# Altium integrated library TI Power Management DC-DC Controller (External Switch).IntLib: 349 symbols (part 14 of 22) (continued)
## TPS51120RHBR (continued)

## TPS51120RHBRG4
designator U?
Dual Current Mode, Synch Step-Down Controller with 100 mA Standby Reg for Notebook System Power, 88 % Duty Cycle, 4.5 to 28 V, -40 to 85 degC, 32-pin QFN (RHB), Green (RoHS & no Sb/Br); Manufacturer: Texas Instruments; PartNumber: TPS51120RHBRG4; Duty Cycle(Max)(%): 88; Iout(Max)(A): 20; Regulated Outputs(#): 2; SubFamily: Multiple-Output Switching Controller; Switching Frequency(Max)(kHz): 580; Synchronous Rectification: TRUE; Topology: Buck, D-CAP Mode"; Vin(Max)(V): 28; Vin(Min)(V): 4.5; Vout(Max)(V): 5.5; Vout(Min)(V): 1.05; DatasheetVersion: SLUS670B; PackageVersion: revD, Jun-2011; PackageReference: RHB32-3450X3450TP; PackageDescription: 32-Pin Plastic Quad Flat No-Lead, 5 x 5 mm Body, 0.5 mm Pitch, 3.45 x 3.45 mm Exposed Pad; Supplier 1: Digi-Key; Supplier Part Number 1: TPS51120RHBRG4-ND; Eco-Plan: Green (RoHS & no Sb/Br); Iout2(A): 20; Vout2(Max)(V): 5.5; Vout2(Min)(V): 1.05; Mounting Technology: Surface Mount; Code_JEDEC: MO-220; ComponentLink1Description: Datasheet; ComponentLink1URL: http://www.ti.com/general/docs/lit/getliterature.tsp?genericPartNumber=TPS51120&fileType=pdf; ComponentLink2Description: Package Specification; ComponentLink2URL: http://www.ti.com/litv/pdf/mpqf130c
footprint RHB32-3450X3450TP (QFN, 32-Leads, Body 5x5mm, Pitch 0.5mm, Thermal Pad 3.45x3.45mm, TI Recommended)
pins: 1 VO1 (in) "These terminals serve four functions: on-time adjustment, output discharge, VREG5, VREG3 switchover input and feedback inputs for 5-V, 3.3-V fixed-output option. Connect to positive terminal of respective switch mode power (See Datasheet)", 2 COMP1 "Loop compensation pin (error amplifier output). Connect RC from this pin to GND for proper loop compensation with current mode operation. Tie this pin to V5FILT for D-CAP mode operation.", 3 VFB1 (in) "SMPS feedback input. Connect the feedback resistor divider here for adjustable outputs. Tie these pins to V5FILT or for fixed output option. Refer to Table 2", 4 VREF2 (out) "2-V reference output. Capable of +/-50-uA, +/-2% over 0 - 85degreesC temperature range. Bypass to GND by 1-nF ceramic capacitor. Tie this pin to GND disables both SMPS.", 5 GND (power) "Signal ground pin.", 6 VFB2 (in) "SMPS feedback input. Connect the feedback resistor divider here for adjustable outputs. Tie these pins to V5FILT or for fixed output option. Refer to Table 2", 7 COMP2 "Loop compensation pin (error amplifier output). Connect RC from this pin to GND for proper loop compensation with current mode operation. Tie this pin to V5FILT for D-CAP mode operation.", 8 VO2 (in) "These terminals serve four functions: on-time adjustment, output discharge, VREG5, VREG3 switchover input and feedback inputs for 5-V, 3.3-V fixed-output option. Connect to positive terminal of respective switch mode power (See Datasheet)", 9 EN5 (in) "VREG5, 5-V low dropout linear regulator enable pin. Connect to GND to disable. Float or tie to VBAT to turn on the regulator.", 10 EN3 (in) "VREG3, 3.3-V low dropout linear regulator enable pin. Connect to GND to disable. Float or tie to enabled VREG5 to turn on the regulator.", 11 PGOOD2 (oc) "Power-good window comparator open drain output. Pull up with resistor to V5FILT or appropriate signal voltage. Current capability is 5-mA. PGOOD goes high 1-ms after VFB is within specified limits. Power bad (terminal goes (See Datasheet)", 12 EN2 (in) "Channel 1 and Channel 2 SMPS enable pins. Connect to 5 V to turn on with internal 3-ms soft-start. Slower soft-start is possible by applying an external capacitor from each of these pins to ground to program ramp rate.", 13 VBST2 (power) "Supply Input for High-side MOSFET Driver. Connect capacitor from this pin to respective LL terminal. An internal PN diode is connected between VREG5 to each of these pins. User can add external schottky diode if forward drop (See Datasheet)", 14 DRVH2 (out) "High-side MOSFET gate drive output. Source 3.5 Ohm, sink 1.5 Ohm, LL-node referenced floating driver. Drive voltage corresponds to VBST to LL voltage.", 15 LL2 (power) "High-side MOSFET gate driver return. Also serve as current sense comparator input (-) for RDS(on) sensing, and input voltage monitor for on-time control circuitry", 16 DRVL2 (out) "Rectifying (low-side) MOSFET gate drive output. Source 3.5 Ohm, sink 1.5 Ohm, PGND referenced driver. Drive voltage is VREG5 voltage.", 17 PGND2 (power) "Ground return for rectifying MOSFET gate driver. Connect PGND2, PGND1 and GND strongly together near the source of the rectifying FET or the GND connection of the current sense resistor. Also serve as current sense (See Datasheet)", 18 CS2 (in) "Current sense comparator input (-) for resistor sensing scheme. Or, overcurrent trip setting input for RDS(on) current sense scheme if connected to V5FILT through the threshold setting resistor.", 19 VREG3 (power) "3.3-V, 100-uA low dropout linear regulator output. Bypass to PGND by 10-mF ceramic capacitor. Runs from VIN supply. Shuts off with EN3. Switches over to VO2 when 3.1 V or above is provided.", 20 V5FILT (power) "5-V supply input for the entire control circuit. Should be provided from VREG5 via RC filter.", 21 VREG5 (power) "5-V, 100-mA low dropout linear regulator output. Bypass to PGND by 10-uF ceramic capacitor. Runs from VIN supply. Internally connected to VBST and DRVL. Shuts off with EN5. Switches over to VO1 when 4.8 V or above is (See Datasheet)", 22 VIN (power) "Supply Input for 5-V and 3.3-V linear regulator. Typically connected to VBAT.", 23 CS1 (in) "Current sense comparator input (-) for resistor sensing scheme. Or, overcurrent trip setting input for RDS(on) current sense scheme if connected to V5FILT through the threshold setting resistor.", 24 PGND1 (power) "Ground return for rectifying MOSFET gate driver. Connect PGND2, PGND1 and GND strongly together near the source of the rectifying FET or the GND connection of the current sense resistor. Also serve as current sense (See Datasheet)", 25 DRVL1 (out) "Rectifying (low-side) MOSFET gate drive output. Source 3.5 Ohm, sink 1.5 Ohm, PGND referenced driver. Drive voltage is VREG5 voltage.", 26 LL1 (power) "High-side MOSFET gate driver return. Also serve as current sense comparator input (-) for RDS(on) sensing, and input voltage monitor for on-time control circuitry", 27 DRVH1 (out) "High-side MOSFET gate drive output. Source 3.5 Ohm, sink 1.5 Ohm, LL-node referenced floating driver. Drive voltage corresponds to VBST to LL voltage.", 28 VBST1 (power) "Supply Input for High-side MOSFET Driver. Connect capacitor from this pin to respective LL terminal. An internal PN diode is connected between VREG5 to each of these pins. User can add external schottky diode if forward drop (See Datasheet)", 29 EN1 (in) "Channel 1 and Channel 2 SMPS enable pins. Connect to 5 V to turn on with internal 3-ms soft-start. Slower soft-start is possible by applying an external capacitor from each of these pins to ground to program ramp rate.", 30 PGOOD1 (oc) "Power-good window comparator open drain output. Pull up with resistor to V5FILT or appropriate signal voltage. Current capability is 5-mA. PGOOD goes high 1-ms after VFB is within specified limits. Power bad (terminal goes (See Datasheet)", 31 TONSEL (in) "On-time selection pin. Refer to Table 1 and Table 2.", 32 SKIPSEL (in) "Skip and fault mode selection pin. Refer to Table 2", 33 EP (power) "EXPOSED THERMAL PAD"

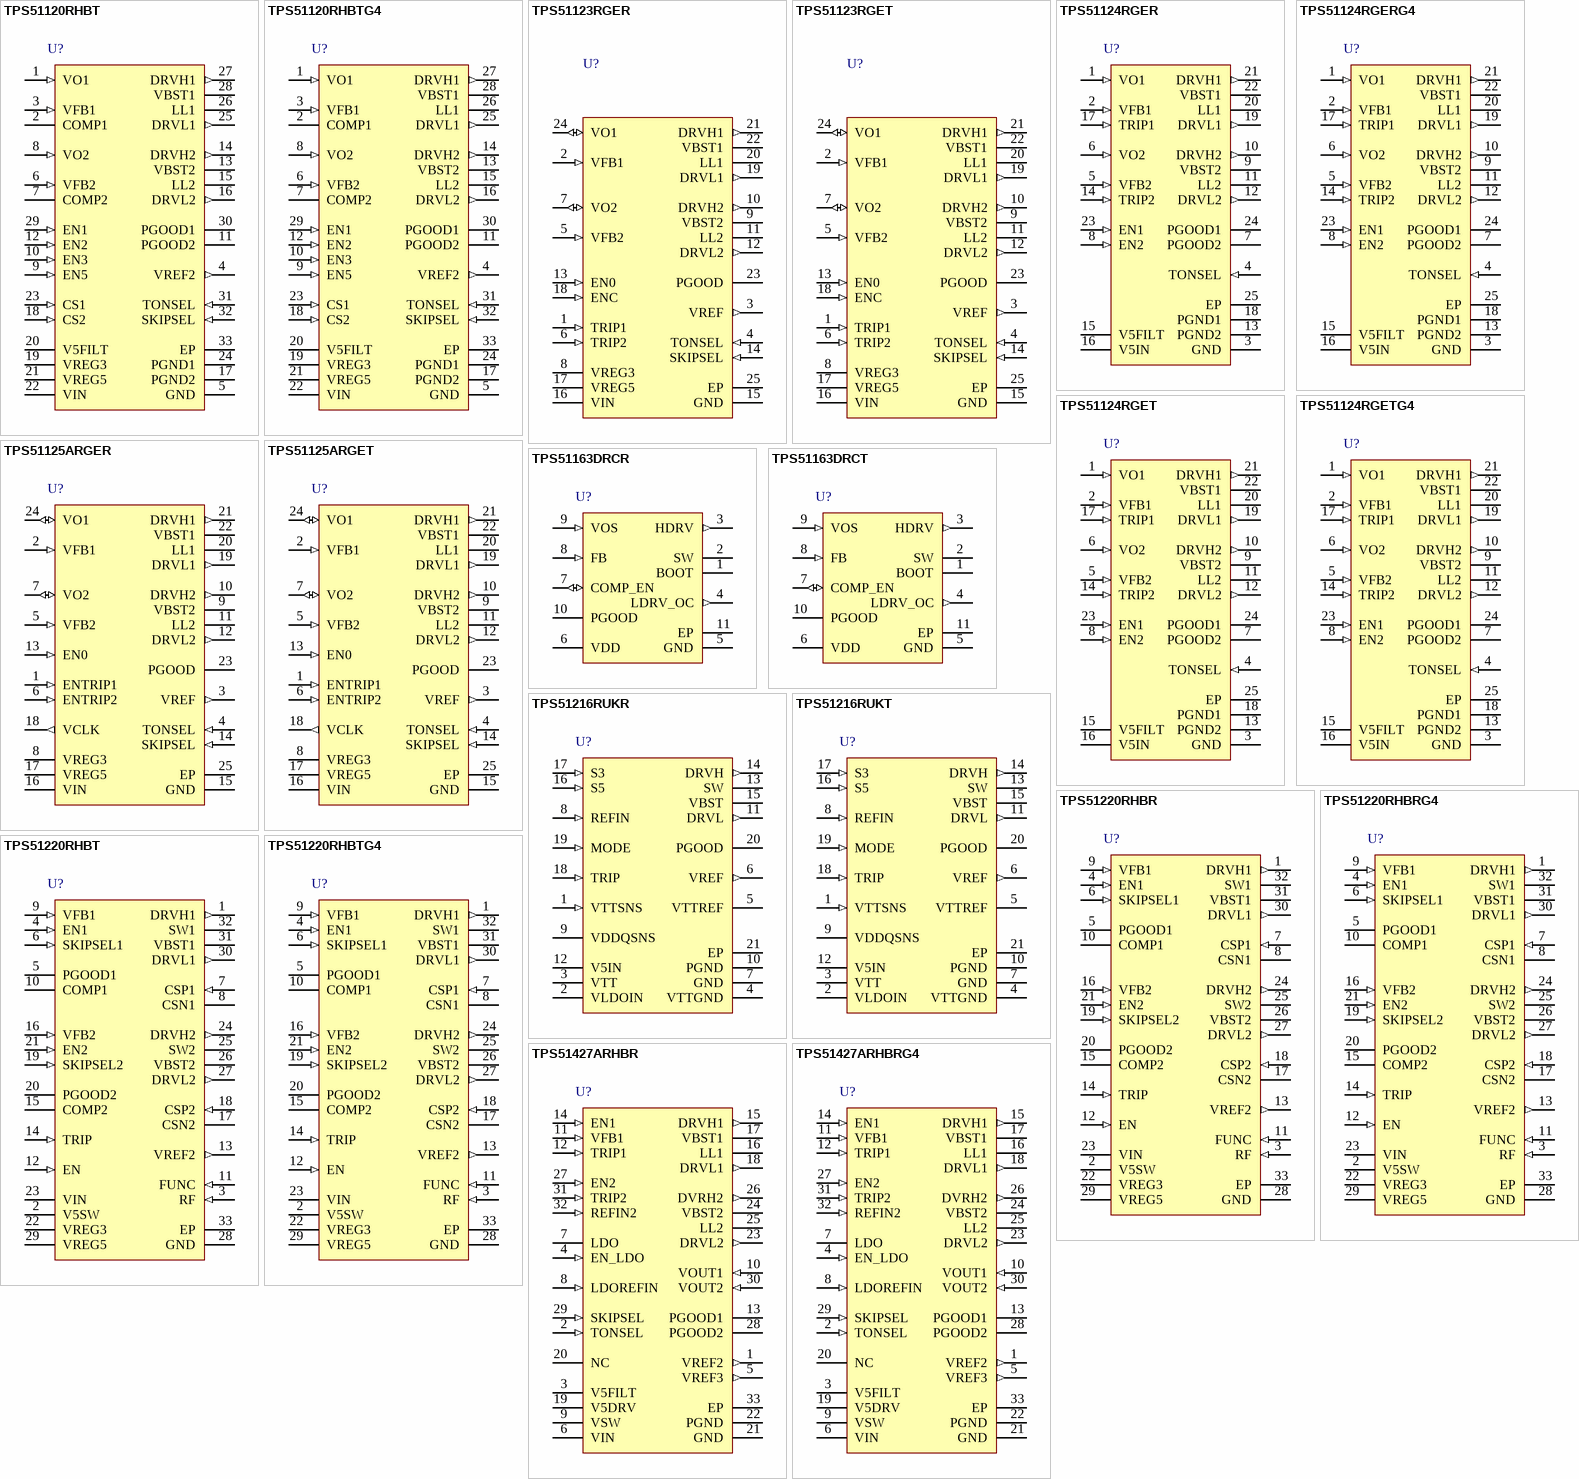
[diagram p10: symbols TPS51120RHBT to TPS51427ARHBRG4]

## TPS51120RHBT
designator U?
Dual Current Mode, Synch Step-Down Controller with 100 mA Standby Reg for Notebook System Power, 88 % Duty Cycle, 4.5 to 28 V, -40 to 85 degC, 32-pin QFN (RHB), Green (RoHS & no Sb/Br); Manufacturer: Texas Instruments; PartNumber: TPS51120RHBT; Duty Cycle(Max)(%): 88; Iout(Max)(A): 20; Regulated Outputs(#): 2; SubFamily: Multiple-Output Switching Controller; Switching Frequency(Max)(kHz): 580; Synchronous Rectification: TRUE; Topology: Buck, D-CAP Mode"; Vin(Max)(V): 28; Vin(Min)(V): 4.5; Vout(Max)(V): 5.5; Vout(Min)(V): 1.05; DatasheetVersion: SLUS670B; PackageVersion: revD, Jun-2011; PackageReference: RHB32-3450X3450TP; PackageDescription: 32-Pin Plastic Quad Flat No-Lead, 5 x 5 mm Body, 0.5 mm Pitch, 3.45 x 3.45 mm Exposed Pad; Supplier 1: Digi-Key; Supplier Part Number 1: 296-18341-2-ND; Eco-Plan: Green (RoHS & no Sb/Br); Iout2(A): 20; Vout2(Max)(V): 5.5; Vout2(Min)(V): 1.05; Mounting Technology: Surface Mount; Code_JEDEC: MO-220; ComponentLink1Description: Datasheet; ComponentLink1URL: http://www.ti.com/general/docs/lit/getliterature.tsp?genericPartNumber=TPS51120&fileType=pdf; ComponentLink2Description: Package Specification; ComponentLink2URL: http://www.ti.com/litv/pdf/mpqf130c
footprint RHB32-3450X3450TP (QFN, 32-Leads, Body 5x5mm, Pitch 0.5mm, Thermal Pad 3.45x3.45mm, TI Recommended)
pins: 1 VO1 (in) "These terminals serve four functions: on-time adjustment, output discharge, VREG5, VREG3 switchover input and feedback inputs for 5-V, 3.3-V fixed-output option. Connect to positive terminal of respective switch mode power (See Datasheet)", 2 COMP1 "Loop compensation pin (error amplifier output). Connect RC from this pin to GND for proper loop compensation with current mode operation. Tie this pin to V5FILT for D-CAP mode operation.", 3 VFB1 (in) "SMPS feedback input. Connect the feedback resistor divider here for adjustable outputs. Tie these pins to V5FILT or for fixed output option. Refer to Table 2", 4 VREF2 (out) "2-V reference output. Capable of +/-50-uA, +/-2% over 0 - 85degreesC temperature range. Bypass to GND by 1-nF ceramic capacitor. Tie this pin to GND disables both SMPS.", 5 GND (power) "Signal ground pin.", 6 VFB2 (in) "SMPS feedback input. Connect the feedback resistor divider here for adjustable outputs. Tie these pins to V5FILT or for fixed output option. Refer to Table 2", 7 COMP2 "Loop compensation pin (error amplifier output). Connect RC from this pin to GND for proper loop compensation with current mode operation. Tie this pin to V5FILT for D-CAP mode operation.", 8 VO2 (in) "These terminals serve four functions: on-time adjustment, output discharge, VREG5, VREG3 switchover input and feedback inputs for 5-V, 3.3-V fixed-output option. Connect to positive terminal of respective switch mode power (See Datasheet)", 9 EN5 (in) "VREG5, 5-V low dropout linear regulator enable pin. Connect to GND to disable. Float or tie to VBAT to turn on the regulator.", 10 EN3 (in) "VREG3, 3.3-V low dropout linear regulator enable pin. Connect to GND to disable. Float or tie to enabled VREG5 to turn on the regulator.", 11 PGOOD2 (oc) "Power-good window comparator open drain output. Pull up with resistor to V5FILT or appropriate signal voltage. Current capability is 5-mA. PGOOD goes high 1-ms after VFB is within specified limits. Power bad (terminal goes (See Datasheet)", 12 EN2 (in) "Channel 1 and Channel 2 SMPS enable pins. Connect to 5 V to turn on with internal 3-ms soft-start. Slower soft-start is possible by applying an external capacitor from each of these pins to ground to program ramp rate.", 13 VBST2 (power) "Supply Input for High-side MOSFET Driver. Connect capacitor from this pin to respective LL terminal. An internal PN diode is connected between VREG5 to each of these pins. User can add external schottky diode if forward drop (See Datasheet)", 14 DRVH2 (out) "High-side MOSFET gate drive output. Source 3.5 Ohm, sink 1.5 Ohm, LL-node referenced floating driver. Drive voltage corresponds to VBST to LL voltage.", 15 LL2 (power) "High-side MOSFET gate driver return. Also serve as current sense comparator input (-) for RDS(on) sensing, and input voltage monitor for on-time control circuitry", 16 DRVL2 (out) "Rectifying (low-side) MOSFET gate drive output. Source 3.5 Ohm, sink 1.5 Ohm, PGND referenced driver. Drive voltage is VREG5 voltage.", 17 PGND2 (power) "Ground return for rectifying MOSFET gate driver. Connect PGND2, PGND1 and GND strongly together near the source of the rectifying FET or the GND connection of the current sense resistor. Also serve as current sense (See Datasheet)", 18 CS2 (in) "Current sense comparator input (-) for resistor sensing scheme. Or, overcurrent trip setting input for RDS(on) current sense scheme if connected to V5FILT through the threshold setting resistor.", 19 VREG3 (power) "3.3-V, 100-uA low dropout linear regulator output. Bypass to PGND by 10-mF ceramic capacitor. Runs from VIN supply. Shuts off with EN3. Switches over to VO2 when 3.1 V or above is provided.", 20 V5FILT (power) "5-V supply input for the entire control circuit. Should be provided from VREG5 via RC filter.", 21 VREG5 (power) "5-V, 100-mA low dropout linear regulator output. Bypass to PGND by 10-uF ceramic capacitor. Runs from VIN supply. Internally connected to VBST and DRVL. Shuts off with EN5. Switches over to VO1 when 4.8 V or above is (See Datasheet)", 22 VIN (power) "Supply Input for 5-V and 3.3-V linear regulator. Typically connected to VBAT.", 23 CS1 (in) "Current sense comparator input (-) for resistor sensing scheme. Or, overcurrent trip setting input for RDS(on) current sense scheme if connected to V5FILT through the threshold setting resistor.", 24 PGND1 (power) "Ground return for rectifying MOSFET gate driver. Connect PGND2, PGND1 and GND strongly together near the source of the rectifying FET or the GND connection of the current sense resistor. Also serve as current sense (See Datasheet)", 25 DRVL1 (out) "Rectifying (low-side) MOSFET gate drive output. Source 3.5 Ohm, sink 1.5 Ohm, PGND referenced driver. Drive voltage is VREG5 voltage.", 26 LL1 (power) "High-side MOSFET gate driver return. Also serve as current sense comparator input (-) for RDS(on) sensing, and input voltage monitor for on-time control circuitry", 27 DRVH1 (out) "High-side MOSFET gate drive output. Source 3.5 Ohm, sink 1.5 Ohm, LL-node referenced floating driver. Drive voltage corresponds to VBST to LL voltage.", 28 VBST1 (power) "Supply Input for High-side MOSFET Driver. Connect capacitor from this pin to respective LL terminal. An internal PN diode is connected between VREG5 to each of these pins. User can add external schottky diode if forward drop (See Datasheet)", 29 EN1 (in) "Channel 1 and Channel 2 SMPS enable pins. Connect to 5 V to turn on with internal 3-ms soft-start. Slower soft-start is possible by applying an external capacitor from each of these pins to ground to program ramp rate.", 30 PGOOD1 (oc) "Power-good window comparator open drain output. Pull up with resistor to V5FILT or appropriate signal voltage. Current capability is 5-mA. PGOOD goes high 1-ms after VFB is within specified limits. Power bad (terminal goes (See Datasheet)", 31 TONSEL (in) "On-time selection pin. Refer to Table 1 and Table 2.", 32 SKIPSEL (in) "Skip and fault mode selection pin. Refer to Table 2", 33 EP (power) "EXPOSED THERMAL PAD"

## TPS51120RHBTG4
designator U?
Dual Current Mode, Synch Step-Down Controller with 100 mA Standby Reg for Notebook System Power, 88 % Duty Cycle, 4.5 to 28 V, -40 to 85 degC, 32-pin QFN (RHB), Green (RoHS & no Sb/Br); Manufacturer: Texas Instruments; PartNumber: TPS51120RHBTG4; Duty Cycle(Max)(%): 88; Iout(Max)(A): 20; Regulated Outputs(#): 2; SubFamily: Multiple-Output Switching Controller; Switching Frequency(Max)(kHz): 580; Synchronous Rectification: TRUE; Topology: Buck, D-CAP Mode"; Vin(Max)(V): 28; Vin(Min)(V): 4.5; Vout(Max)(V): 5.5; Vout(Min)(V): 1.05; DatasheetVersion: SLUS670B; PackageVersion: revD, Jun-2011; PackageReference: RHB32-3450X3450TP; PackageDescription: 32-Pin Plastic Quad Flat No-Lead, 5 x 5 mm Body, 0.5 mm Pitch, 3.45 x 3.45 mm Exposed Pad; Supplier 1: Digi-Key; Supplier Part Number 1: TPS51120RHBTG4-ND; Eco-Plan: Green (RoHS & no Sb/Br); Iout2(A): 20; Vout2(Max)(V): 5.5; Vout2(Min)(V): 1.05; Mounting Technology: Surface Mount; Code_JEDEC: MO-220; ComponentLink1Description: Datasheet; ComponentLink1URL: http://www.ti.com/general/docs/lit/getliterature.tsp?genericPartNumber=TPS51120&fileType=pdf; ComponentLink2Description: Package Specification; ComponentLink2URL: http://www.ti.com/litv/pdf/mpqf130c
footprint RHB32-3450X3450TP (QFN, 32-Leads, Body 5x5mm, Pitch 0.5mm, Thermal Pad 3.45x3.45mm, TI Recommended)
pins: 1 VO1 (in) "These terminals serve four functions: on-time adjustment, output discharge, VREG5, VREG3 switchover input and feedback inputs for 5-V, 3.3-V fixed-output option. Connect to positive terminal of respective switch mode power (See Datasheet)", 2 COMP1 "Loop compensation pin (error amplifier output). Connect RC from this pin to GND for proper loop compensation with current mode operation. Tie this pin to V5FILT for D-CAP mode operation.", 3 VFB1 (in) "SMPS feedback input. Connect the feedback resistor divider here for adjustable outputs. Tie these pins to V5FILT or for fixed output option. Refer to Table 2", 4 VREF2 (out) "2-V reference output. Capable of +/-50-uA, +/-2% over 0 - 85degreesC temperature range. Bypass to GND by 1-nF ceramic capacitor. Tie this pin to GND disables both SMPS.", 5 GND (power) "Signal ground pin.", 6 VFB2 (in) "SMPS feedback input. Connect the feedback resistor divider here for adjustable outputs. Tie these pins to V5FILT or for fixed output option. Refer to Table 2", 7 COMP2 "Loop compensation pin (error amplifier output). Connect RC from this pin to GND for proper loop compensation with current mode operation. Tie this pin to V5FILT for D-CAP mode operation.", 8 VO2 (in) "These terminals serve four functions: on-time adjustment, output discharge, VREG5, VREG3 switchover input and feedback inputs for 5-V, 3.3-V fixed-output option. Connect to positive terminal of respective switch mode power (See Datasheet)", 9 EN5 (in) "VREG5, 5-V low dropout linear regulator enable pin. Connect to GND to disable. Float or tie to VBAT to turn on the regulator.", 10 EN3 (in) "VREG3, 3.3-V low dropout linear regulator enable pin. Connect to GND to disable. Float or tie to enabled VREG5 to turn on the regulator.", 11 PGOOD2 (oc) "Power-good window comparator open drain output. Pull up with resistor to V5FILT or appropriate signal voltage. Current capability is 5-mA. PGOOD goes high 1-ms after VFB is within specified limits. Power bad (terminal goes (See Datasheet)", 12 EN2 (in) "Channel 1 and Channel 2 SMPS enable pins. Connect to 5 V to turn on with internal 3-ms soft-start. Slower soft-start is possible by applying an external capacitor from each of these pins to ground to program ramp rate.", 13 VBST2 (power) "Supply Input for High-side MOSFET Driver. Connect capacitor from this pin to respective LL terminal. An internal PN diode is connected between VREG5 to each of these pins. User can add external schottky diode if forward drop (See Datasheet)", 14 DRVH2 (out) "High-side MOSFET gate drive output. Source 3.5 Ohm, sink 1.5 Ohm, LL-node referenced floating driver. Drive voltage corresponds to VBST to LL voltage.", 15 LL2 (power) "High-side MOSFET gate driver return. Also serve as current sense comparator input (-) for RDS(on) sensing, and input voltage monitor for on-time control circuitry", 16 DRVL2 (out) "Rectifying (low-side) MOSFET gate drive output. Source 3.5 Ohm, sink 1.5 Ohm, PGND referenced driver. Drive voltage is VREG5 voltage.", 17 PGND2 (power) "Ground return for rectifying MOSFET gate driver. Connect PGND2, PGND1 and GND strongly together near the source of the rectifying FET or the GND connection of the current sense resistor. Also serve as current sense (See Datasheet)", 18 CS2 (in) "Current sense comparator input (-) for resistor sensing scheme. Or, overcurrent trip setting input for RDS(on) current sense scheme if connected to V5FILT through the threshold setting resistor.", 19 VREG3 (power) "3.3-V, 100-uA low dropout linear regulator output. Bypass to PGND by 10-mF ceramic capacitor. Runs from VIN supply. Shuts off with EN3. Switches over to VO2 when 3.1 V or above is provided.", 20 V5FILT (power) "5-V supply input for the entire control circuit. Should be provided from VREG5 via RC filter.", 21 VREG5 (power) "5-V, 100-mA low dropout linear regulator output. Bypass to PGND by 10-uF ceramic capacitor. Runs from VIN supply. Internally connected to VBST and DRVL. Shuts off with EN5. Switches over to VO1 when 4.8 V or above is (See Datasheet)", 22 VIN (power) "Supply Input for 5-V and 3.3-V linear regulator. Typically connected to VBAT.", 23 CS1 (in) "Current sense comparator input (-) for resistor sensing scheme. Or, overcurrent trip setting input for RDS(on) current sense scheme if connected to V5FILT through the threshold setting resistor.", 24 PGND1 (power) "Ground return for rectifying MOSFET gate driver. Connect PGND2, PGND1 and GND strongly together near the source of the rectifying FET or the GND connection of the current sense resistor. Also serve as current sense (See Datasheet)", 25 DRVL1 (out) "Rectifying (low-side) MOSFET gate drive output. Source 3.5 Ohm, sink 1.5 Ohm, PGND referenced driver. Drive voltage is VREG5 voltage.", 26 LL1 (power) "High-side MOSFET gate driver return. Also serve as current sense comparator input (-) for RDS(on) sensing, and input voltage monitor for on-time control circuitry", 27 DRVH1 (out) "High-side MOSFET gate drive output. Source 3.5 Ohm, sink 1.5 Ohm, LL-node referenced floating driver. Drive voltage corresponds to VBST to LL voltage.", 28 VBST1 (power) "Supply Input for High-side MOSFET Driver. Connect capacitor from this pin to respective LL terminal. An internal PN diode is connected between VREG5 to each of these pins. User can add external schottky diode if forward drop (See Datasheet)", 29 EN1 (in) "Channel 1 and Channel 2 SMPS enable pins. Connect to 5 V to turn on with internal 3-ms soft-start. Slower soft-start is possible by applying an external capacitor from each of these pins to ground to program ramp rate.", 30 PGOOD1 (oc) "Power-good window comparator open drain output. Pull up with resistor to V5FILT or appropriate signal voltage. Current capability is 5-mA. PGOOD goes high 1-ms after VFB is within specified limits. Power bad (terminal goes (See Datasheet)", 31 TONSEL (in) "On-time selection pin. Refer to Table 1 and Table 2.", 32 SKIPSEL (in) "Skip and fault mode selection pin. Refer to Table 2", 33 EP (power) "EXPOSED THERMAL PAD"